# Altium schematic symbol library Semi-ATE.SchLib: 322 symbols (part 1 of 6) (continued)
## C+_1 (continued)
CAP TANT 10UF 10% 35V 2312; 04. Manufacturer: Vishay Sprague; 07. Manufacturer  Part Number: TR3C106K035C0450; ESR: 450 mOhm; Type: Tantalum; 03. Unit Price: 0.4; 13. Created Date/Name: AUG2018/Hören; Design: AWGDIG; 3D-Export: No; ComponentLink1Description: Info; ComponentLink1URL: https://www.digikey.de/product-detail/en/vishay-sprague/TR3C106K035C0450/718-1323-2-ND/1579612; Tolerance: ±10%; Voltage Rating: 35V; 02. Distributor Part Number: 718-1323-2-ND; 09. Operating Temperature: -55°C ~ 125°C; 11. RoHS: YES; 01. Distributor: DigiKey; ComponentLink2Description: DataSheet; ComponentLink2URL: http://www.vishay.com/docs/40080/tr3.pdf; Package: 2312
simulation model CAP (Capacitor)
signal-integrity model Cap
footprint SMD-CAP-ALU-A (Ø3.0mm x 5.4mm)
footprint SMD-CAP-ALU-B (Ø4.0mm x 5.4mm)
footprint SMD-CAP-ALU-C (Ø5.0mm x 5.4mm)
footprint SMD-CAP-ALU-D (Ø6.3mm x 5.4mm)
footprint SMD-CAP-ALU-D8 (Ø6.3mm x 7.7mm)
footprint SMD-CAP-ALU-E (Ø8.0mm x 6.2mm)
footprint SMD-CAP-ALU-F (Ø8.0mm x 10.2mm)
footprint SMD-CAP-ALU-G (Ø10.0mm x 10.2mm)
footprint SMD-CAP-ALU-G13 (Ø10.0mm x 13.5mm)
footprint SMD-CAP-ALU-G17 (Ø10.0mm x 16.5mm)
footprint SMD-CAP-ALU-H16 (Ø12.5mm x 16.5mm)
footprint SMD-CAP-ALU-K16 (Ø18mm x 16.5mm)
footprint C2312 (SMT 2312 Tantalum)
pins: 1, 2
text: +

## C+_2
designator C?, comment value 100uF  (hidden comment: C+)
CAP TANT 100UF 10% 6.3V 1411; 04. Manufacturer: AVX Corporation; 07. Manufacturer  Part Number: TPSB107K006R0250; ESR: 250mΩ; Type: Tantalum; 03. Unit Price: 0.58; 13. Created Date/Name: AUG2018/Hören; 3D-Export: No; ComponentLink1Description: Info; ComponentLink1URL: https://www.digikey.de/products/en?keywords=478-3080-1-ND; Tolerance: ±10%; Voltage Rating: 6.3V; 02. Distributor Part Number: 478-3080-1-ND; 09. Operating Temperature: -55°C ~ 125°C; 11. RoHS: YES; 01. Distributor: DigiKey; ComponentLink2Description: DataSheet; ComponentLink2URL: http://datasheets.avx.com/TPS.pdf; Package: 1210
simulation model CAP (Capacitor)
signal-integrity model Cap
footprint SMD-CAP-ALU-A (Ø3.0mm x 5.4mm)
footprint SMD-CAP-ALU-B (Ø4.0mm x 5.4mm)
footprint SMD-CAP-ALU-C (Ø5.0mm x 5.4mm)
footprint SMD-CAP-ALU-D (Ø6.3mm x 5.4mm)
footprint SMD-CAP-ALU-D8 (Ø6.3mm x 7.7mm)
footprint SMD-CAP-ALU-E (Ø8.0mm x 6.2mm)
footprint SMD-CAP-ALU-F (Ø8.0mm x 10.2mm)
footprint SMD-CAP-ALU-G (Ø10.0mm x 10.2mm)
footprint SMD-CAP-ALU-G13 (Ø10.0mm x 13.5mm)
footprint SMD-CAP-ALU-G17 (Ø10.0mm x 16.5mm)
footprint SMD-CAP-ALU-H16 (Ø12.5mm x 16.5mm)
footprint SMD-CAP-ALU-K16 (Ø18mm x 16.5mm)
footprint C0603+ Reflow (SMT Capacitor 0603 Polarized Reflow Soldering)
footprint C0603+ Wave (SMT Capacitor 0603 Polarized Wave Soldering)
footprint C1206+ Reflow (SMT Capacitor 1206 Polarized Reflow Soldering)
footprint C1206+ Wave (SMT Capacitor 1206 Polarized Wave Soldering)
footprint C1210+ Reflow (SMT Capacitor 1210 Polarized Reflow Soldering)
footprint C1210+ Wave (SMT Capacitor 1210 Polarized Wave Soldering)
footprint C2312+ Reflow (SMT Capacitor 2312 Polarized Reflow Soldering)
footprint C2312+ Wave (SMT Capacitor 2312 Polarized Wave Soldering)
footprint C0805+ Reflow (SMT Capacitor 0805 Polarized Reflow Soldering)
footprint C0805+ Wave (SMT Capacitor 0805 Polarized Wave Soldering)
pins: 1, 2
text: +

## C+_3
designator C?, comment value 10uF  Tolerance: ±20%  Type: Tantalum  Package: 0805  (hidden comment: C+)
CAP TANT 10UF 20% 10V 0805; 04. Manufacturer: AVX Corporation; 07. Manufacturer  Part Number: TPSP106M010R2000; ESR: 2Ohm; 03. Unit Price: 1.07; 13. Created Date/Name: AUG2018/Hören; 3D-Export: No; ComponentLink1Description: Info; ComponentLink1URL: https://www.digikey.de/products/en?keywords=478-9264-1-ND; Voltage Rating: 10V; 02. Distributor Part Number: 478-9264-1-ND; 09. Operating Temperature: -55°C ~ 125°C; 11. RoHS: YES; 01. Distributor: DigiKey; ComponentLink2Description: DataSheet; ComponentLink2URL: http://datasheets.avx.com/TPS.pdf
simulation model CAP (Capacitor)
signal-integrity model Cap
footprint SMD-CAP-ALU-A (Ø3.0mm x 5.4mm)
footprint SMD-CAP-ALU-B (Ø4.0mm x 5.4mm)
footprint SMD-CAP-ALU-C (Ø5.0mm x 5.4mm)
footprint SMD-CAP-ALU-D (Ø6.3mm x 5.4mm)
footprint SMD-CAP-ALU-D8 (Ø6.3mm x 7.7mm)
footprint SMD-CAP-ALU-E (Ø8.0mm x 6.2mm)
footprint SMD-CAP-ALU-F (Ø8.0mm x 10.2mm)
footprint SMD-CAP-ALU-G (Ø10.0mm x 10.2mm)
footprint SMD-CAP-ALU-G13 (Ø10.0mm x 13.5mm)
footprint SMD-CAP-ALU-G17 (Ø10.0mm x 16.5mm)
footprint SMD-CAP-ALU-H16 (Ø12.5mm x 16.5mm)
footprint SMD-CAP-ALU-K16 (Ø18mm x 16.5mm)
footprint C0603+ Reflow (SMT Capacitor 0603 Polarized Reflow Soldering)
footprint C0603+ Wave (SMT Capacitor 0603 Polarized Wave Soldering)
footprint C1206+ Reflow (SMT Capacitor 1206 Polarized Reflow Soldering)
footprint C1206+ Wave (SMT Capacitor 1206 Polarized Wave Soldering)
footprint C1210+ Reflow (SMT Capacitor 1210 Polarized Reflow Soldering)
footprint C1210+ Wave (SMT Capacitor 1210 Polarized Wave Soldering)
footprint C2312+ Reflow (SMT Capacitor 2312 Polarized Reflow Soldering)
footprint C2312+ Wave (SMT Capacitor 2312 Polarized Wave Soldering)
footprint C0805+ Reflow (SMT Capacitor 0805 Polarized Reflow Soldering)
footprint C0805+ Wave (SMT Capacitor 0805 Polarized Wave Soldering)
pins: 1, 2
text: +

## C+_4
designator C?, comment value 1uF  Type: Tantalum  Package: 0805  (hidden comment: C+)
CAP TANT 1UF 10% 25V 0805; 04. Manufacturer: AVX Corporation; 07. Manufacturer  Part Number: TPSR105K025R2500; ESR: 2.5Ohm; 03. Unit Price: 0.55; 13. Created Date/Name: AUG2018/Hören; 3D-Export: No; ComponentLink1Description: Info; ComponentLink1URL: https://www.digikey.de/products/en?keywords=478-11121-1-ND; Tolerance: ±10%; Voltage Rating: 25V; 02. Distributor Part Number: 478-11121-1-ND; 09. Operating Temperature: -55°C ~ 125°C; 11. RoHS: YES; 01. Distributor: DigiKey; ComponentLink2Description: DataSheet; ComponentLink2URL: http://datasheets.avx.com/TPS.pdf
simulation model CAP (Capacitor)
signal-integrity model Cap
footprint SMD-CAP-ALU-A (Ø3.0mm x 5.4mm)
footprint SMD-CAP-ALU-B (Ø4.0mm x 5.4mm)
footprint SMD-CAP-ALU-C (Ø5.0mm x 5.4mm)
footprint SMD-CAP-ALU-D (Ø6.3mm x 5.4mm)
footprint SMD-CAP-ALU-D8 (Ø6.3mm x 7.7mm)
footprint SMD-CAP-ALU-E (Ø8.0mm x 6.2mm)
footprint SMD-CAP-ALU-F (Ø8.0mm x 10.2mm)
footprint SMD-CAP-ALU-G (Ø10.0mm x 10.2mm)
footprint SMD-CAP-ALU-G13 (Ø10.0mm x 13.5mm)
footprint SMD-CAP-ALU-G17 (Ø10.0mm x 16.5mm)
footprint SMD-CAP-ALU-H16 (Ø12.5mm x 16.5mm)
footprint SMD-CAP-ALU-K16 (Ø18mm x 16.5mm)
footprint C0603+ Reflow (SMT Capacitor 0603 Polarized Reflow Soldering)
footprint C0603+ Wave (SMT Capacitor 0603 Polarized Wave Soldering)
footprint C1206+ Reflow (SMT Capacitor 1206 Polarized Reflow Soldering)
footprint C1206+ Wave (SMT Capacitor 1206 Polarized Wave Soldering)
footprint C1210+ Reflow (SMT Capacitor 1210 Polarized Reflow Soldering)
footprint C1210+ Wave (SMT Capacitor 1210 Polarized Wave Soldering)
footprint C2312+ Reflow (SMT Capacitor 2312 Polarized Reflow Soldering)
footprint C2312+ Wave (SMT Capacitor 2312 Polarized Wave Soldering)
footprint C0805+ Reflow (SMT Capacitor 0805 Polarized Reflow Soldering)
footprint C0805+ Wave (SMT Capacitor 0805 Polarized Wave Soldering)
pins: 1, 2
text: +

## C_1
designator C?, comment value 47uF  (hidden comment: C)
CAP CER 47UF 10V X5R 1206; MFR-PN: GRM32ER71A476KE15L; MFR: MURATA; MFR-TYPE: GRM series; 04. Manufacturer: Samsung Electro-Mechanics; 07. Manufacturer  Part Number: CL31A476MPHNNNE; POPULATED: yes; Parameters: X7R, 10V, 10%; 03. Unit Price: 0.64; Tolerance: ±20%; Type: X7R; 3D-Export: No; Temperature Range: -55°C ~ 85°C; 01. Distributor: DigiKey; 02. Distributor Part Number: 1276-3063-6-ND; 09. Operating Temperature: -55°C ~ 85°C; 11. RoHS: YES; Voltage Rating: 10V; ComponentLink4Description: Info; ComponentLink4URL: https://www.digikey.de/product-detail/en/samsung-electro-mechanics/CL31A476MPHNNNE/1276-3063-6-ND/3893578; ComponentLink5Description: DataSheet; ComponentLink5URL: https://media.digikey.com/pdf/Data%20Sheets/Samsung%20PDFs/CL_Series_MLCC_ds.pdf
footprint C1206 (Footprint not found)
signal-integrity model Cap
simulation model CAP
footprint C1210
footprint C1206 Reflow
pins: 1, 2
2 alternate drawings of the same symbol

## C_2
designator C?, comment value 1uF  (hidden comment: C)
CAP CER 1UF 10V X5R 0402; 04. Manufacturer: Samsung Electro-Mechanics; 07. Manufacturer  Part Number: CL05A105KP5NNNC; POPULATED: yes; Parameters: X7R, 10V, 10%; 03. Unit Price: 0.09; Tolerance: 10%; Type: X7R; 3D-Export: No; Temperature Range: -40°C/+85°C; 01. Distributor: DigiKey; 02. Distributor Part Number: 1276-1076-6-ND; 09. Operating Temperature: -55°C ~ 85°C; 11. RoHS: YES; Voltage Rating: 10V; ComponentLink4Description: Info; ComponentLink4URL: https://www.digikey.de/product-detail/en/samsung-electro-mechanics/CL05A105KP5NNNC/1276-1076-6-ND/3891590; ComponentLink5Description: DataSheet; ComponentLink5URL: https://media.digikey.com/pdf/Data%20Sheets/Samsung%20PDFs/CL_Series_MLCC_ds.pdf
footprint C0603 (Footprint not found)
footprint C0402 (Chip Capacitor; Body 1.0x0.5mm (LxW typ), IPC High Density)
signal-integrity model Cap
simulation model CAP
footprint C0402 RevOne
pins: 1, 2
2 alternate drawings of the same symbol

## C_3
designator C?, comment value 100nF  (hidden comment: C)
CAP CER 0.1UF 25V X7R 0402; 04. Manufacturer: Yageo; 07. Manufacturer  Part Number: CC0402KRX7R8BB104; POPULATED: yes; Parameters: X7R, 25V, 10%; 03. Unit Price: 0.09; Tolerance: 10%; 3D-Export: No; Temperature Range: -40°C/+85°C; 01. Distributor: DigiKey; 02. Distributor Part Number: 311-2077-6-ND; 09. Operating Temperature: -55°C ~ 125°C; 11. RoHS: YES; Type: X7R; Voltage Rating: 25V
footprint C0402 (Footprint not found)
signal-integrity model Cap
simulation model CAP
footprint C0402 RevOne
pins: 1, 2
2 alternate drawings of the same symbol

## C_4
designator C?, comment value 4u7F  (hidden comment: C)
CAP CER 4.7UF 6.3V X5R 0402; 04. Manufacturer: Samsung Electro-Mechanics; 07. Manufacturer  Part Number: CL05A475KQ5NRNC; POPULATED: yes; Parameters: X7R, 6V3, 10%; 03. Unit Price: 0.28; Tolerance: 10%; Type: X7R; Voltage Rating: 6V3; 3D-Export: No; Temperature Range: -40°C/+85°C; 01. Distributor: DigiKey; 02. Distributor Part Number: 1276-1481-6-ND; 09. Operating Temperature: -55°C ~ 85°C; 11. RoHS: YES; ComponentLink4Description: DataSheet; ComponentLink4URL: https://media.digikey.com/pdf/Data%20Sheets/Samsung%20PDFs/CL_Series_MLCC_ds.pdf; ComponentLink5Description: Info; ComponentLink5URL: https://www.digikey.de/product-detail/en/samsung-electro-mechanics/CL05A475KQ5NRNC/1276-1481-6-ND/3891995
footprint C0402 (Chip Capacitor; Body 1.0x0.5mm (LxW typ), IPC High Density)
signal-integrity model Cap
simulation model CAP
footprint C0805
footprint C0402 RevOne
pins: 1, 2
2 alternate drawings of the same symbol

## C_5
designator C?, comment value 470nF  (hidden comment: C)
CAP CER 0.47UF 10V X5R 0402; 04. Manufacturer: Samsung Electro-Mechanics; 07. Manufacturer  Part Number: CL05A474KP5NNNC; POPULATED: yes; Parameters: X5R, 10V, 10%; 03. Unit Price: 0.09; Tolerance: 10%; 3D-Export: No; Temperature Range: -55°C ~ 85°C; 01. Distributor: DigiKey; 02. Distributor Part Number: 1276-1173-6-ND; 09. Operating Temperature: -55°C ~ 85°C; 11. RoHS: YES; Type: X5R; Voltage Rating: 10V; ComponentLink4Description: Info; ComponentLink4URL: https://www.digikey.de/product-detail/en/samsung-electro-mechanics/CL05A474KP5NNNC/1276-1173-6-ND/3891687; ComponentLink5Description: DataSheet; ComponentLink5URL: https://media.digikey.com/pdf/Data%20Sheets/Samsung%20PDFs/CL_Series_MLCC_ds.pdf
footprint C0402 (Chip Capacitor; Body 1.0x0.5mm (LxW typ), IPC High Density)
signal-integrity model Cap
simulation model CAP
footprint C0402 RevOne
pins: 1, 2
2 alternate drawings of the same symbol

## C_6
designator C?, comment value 10µF  Package: 0603  (hidden comment: C)
CAP CER 10UF 16V X5R 0603; 04. Manufacturer: Murata Electronics North America; 07. Manufacturer  Part Number: GRM188R61C106KAALD; Tolerance: ±10%; 03. Unit Price: 0.43; 08. Inhouse Stock: -40°C/+85°C; 13. Created Date/Name: AUG2018/Hören; Design: AWGDIG; 3D-Export: No; Voltage Rating: 16V; Type: X5R; ComponentLink1Description: Info; ComponentLink1URL: https://www.digikey.de/products/en?keywords=490-10728-6-ND; 02. Distributor Part Number: 490-10728-6-ND; 09. Operating Temperature: -55°C ~ 85°C; 11. RoHS: YES; 01. Distributor: DigiKey; ComponentLink2Description: DataSheet; ComponentLink2URL: https://search.murata.co.jp/Ceramy/image/img/A01X/G101/ENG/GRM188R61C106KAAL-01.pdf
simulation model CAP (Capacitor)
signal-integrity model Cap
footprint C0201
footprint C0402 (SMT Capacitor 0402)
footprint C0603 (SMT Capacitor 0603)
footprint C0603 (SMT Capacitor 0603)
footprint C0805 (SMT Capacitor 0805)
footprint C1206 (SMT Capacitor 1206)
footprint C1210 (SMT Capacitor 1210)
footprint C1632
footprint C1825
footprint C2225
footprint C0603 Reflow
pins: 1, 2
text: .

## C_7
designator C?, comment value 10nF  (hidden comment: C)
CAP CER 10000PF 10V X7R 0402; 04. Manufacturer: KEMET; 07. Manufacturer  Part Number: C0402C103K8RACTU; Tolerance: ±10%; Voltage Rating: 16V; 03. Unit Price: 0.09; 13. Created Date/Name: AUG2018/Hören; Design: AWGDIG; 3D-Export: No; Type: X7R; ComponentLink1Description: Info; ComponentLink1URL: https://www.digikey.de/product-detail/en/kemet/C0402C103K8RACTU/399-7759-6-ND/3472290; 02. Distributor Part Number: 399-7759-6-ND; 09. Operating Temperature: -55°C ~ 125°C; 11. RoHS: YES; 01. Distributor: DigiKey; ComponentLink2Description: DataSheet; ComponentLink2URL: https://api.kemet.com/component-edge/download/datasheet/C0402C103K8RACTU.pdf; Package: 0402
simulation model CAP (Capacitor)
signal-integrity model Cap
footprint C0201
footprint C0402 (SMT Capacitor 0402)
footprint C0603 (SMT Capacitor 0603)
footprint C0603 (SMT Capacitor 0603)
footprint C0805 (SMT Capacitor 0805)
footprint C1206 (SMT Capacitor 1206)
footprint C1210 (SMT Capacitor 1210)
footprint C1632
footprint C1825
footprint C2225
footprint C0402 RevOne
pins: 1, 2
text: .

## C_8
designator C?, comment value 1nF  (hidden comment: C)
CAP CER 1000PF 25V X7R 0402; 04. Manufacturer: Yageo; 07. Manufacturer  Part Number: CC0402KRX7R8BB102; Tolerance: ±10%; 03. Unit Price: 0.09; 13. Created Date/Name: AUG2018/Hören; Design: AWGDIG; 3D-Export: No; Voltage Rating: 25V; Type: X7R; ComponentLink1Description: Info; ComponentLink1URL: https://www.digikey.de/product-detail/en/yageo/CC0402KRX7R8BB102/311-1712-6-ND/5196110; 02. Distributor Part Number: 311-1712-6-ND; 09. Operating Temperature: -55°C ~ 125°C; 11. RoHS: YES; 01. Distributor: DigiKey; ComponentLink2Description: DataSheet; ComponentLink2URL: http://www.yageo.com/documents/recent/UPY-GPHC_X7R_6.3V-to-50V_18.pdf; Package: 0402
simulation model CAP (Capacitor)
signal-integrity model Cap
footprint C0201
footprint C0402 (SMT Capacitor 0402)
footprint C0603 (SMT Capacitor 0603)
footprint C0603 (SMT Capacitor 0603)
footprint C0805 (SMT Capacitor 0805)
footprint C1206 (SMT Capacitor 1206)
footprint C1210 (SMT Capacitor 1210)
footprint C1632
footprint C1825
footprint C2225
footprint C0402 Reflow
pins: 1, 2
text: .

## C_9
designator C?, comment value 100nF  (hidden comment: C)
CAP CER 0.1UF 16V X7R 0402; 04. Manufacturer: Samsung Electro-Mechanics; 07. Manufacturer  Part Number: CL05B104KO5NNNC; Tolerance: ±10%; 03. Unit Price: 0.09; 13. Created Date/Name: AUG2018/Hören; Design: AWGDIG; 3D-Export: No; Voltage Rating: 16V; Type: X7R; ComponentLink1Description: Info; ComponentLink1URL: https://www.digikey.de/product-detail/en/samsung-electro-mechanics/CL05B104KO5NNNC/1276-1001-6-ND/3891515; 02. Distributor Part Number: 1276-1001-6-ND; 09. Operating Temperature: -55°C ~ 125°C; 11. RoHS: YES; 01. Distributor: DigiKey; ComponentLink2Description: DataSheet; ComponentLink2URL: http://www.samsungsem.com/kr/support/product-search/mlcc/__icsFiles/afieldfile/2018/07/18/CL05B104KO5NNNC.pdf; Package: 0402.
simulation model CAP (Capacitor)
signal-integrity model Cap
footprint C0201
footprint C0402 (SMT Capacitor 0402)
footprint C0603 (SMT Capacitor 0603)
footprint C0603 (SMT Capacitor 0603)
footprint C0805 (SMT Capacitor 0805)
footprint C1206 (SMT Capacitor 1206)
footprint C1210 (SMT Capacitor 1210)
footprint C1632
footprint C1825
footprint C2225
footprint C0402 Reflow
pins: 1, 2
text: .

## C_10
designator C?, comment value 10µF  Package: 0603  (hidden comment: C)
CAP CER 10UF 16V X5R 0603; 04. Manufacturer: Murata Electronics North America; 07. Manufacturer  Part Number: GRM188R61C106KAALD; Tolerance: ±10%; 03. Unit Price: 0.43; 13. Created Date/Name: AUG2018/Hören; Design: AWGDIG; 3D-Export: No; Voltage Rating: 16V; Type: X5R; ComponentLink1Description: Info; ComponentLink1URL: https://www.digikey.de/products/en?keywords=490-10728-6-ND; 02. Distributor Part Number: 490-10728-6-ND; 09. Operating Temperature: -55°C ~ 85°C; 11. RoHS: YES; 01. Distributor: DigiKey; ComponentLink2Description: DataSheet; ComponentLink2URL: https://search.murata.co.jp/Ceramy/image/img/A01X/G101/ENG/GRM188R61C106KAAL-01.pdf
simulation model CAP (Capacitor)
signal-integrity model Cap
footprint C0201
footprint C0402 (SMT Capacitor 0402)
footprint C0603 (SMT Capacitor 0603)
footprint C0603 (SMT Capacitor 0603)
footprint C0805 (SMT Capacitor 0805)
footprint C1206 (SMT Capacitor 1206)
footprint C1210 (SMT Capacitor 1210)
footprint C1632
footprint C1825
footprint C2225
footprint C0603 Reflow
pins: 1, 2
text: .

## C_11
designator C?, comment value 820pF  Tolerance: ±5%  (hidden comment: C)
CAP CER 820PF 50V X7R 0402; 04. Manufacturer: AVX Corporation; 07. Manufacturer  Part Number: 04025C821JAT2A; 03. Unit Price: 0.34; 13. Created Date/Name: AUG2018/Hören; Design: AWGDIG; 3D-Export: No; Voltage Rating: 50V; Type: X7R; ComponentLink1Description: Info; ComponentLink1URL: https://www.digikey.de/product-detail/en/avx-corporation/04025C821JAT2A/478-10130-6-ND/6796643; 02. Distributor Part Number: 478-10130-6-ND; 09. Operating Temperature: -55°C ~ 125°C; 11. RoHS: YES; 01. Distributor: DigiKey; ComponentLink2Description: DataSheet; ComponentLink2URL: http://datasheets.avx.com/X7RDielectric.pdf; Package: 0402
simulation model CAP (Capacitor)
signal-integrity model Cap
footprint C0201
footprint C0402 (SMT Capacitor 0402)
footprint C0603 (SMT Capacitor 0603)
footprint C0603 (SMT Capacitor 0603)
footprint C0805 (SMT Capacitor 0805)
footprint C1206 (SMT Capacitor 1206)
footprint C1210 (SMT Capacitor 1210)
footprint C1632
footprint C1825
footprint C2225
footprint C0402 Reflow
pins: 1, 2
text: .

## C_12
designator C?, comment value 68nF  Tolerance: ±5%  (hidden comment: C)
CAP CER SMD 0402 .068UF 5% X7R; 04. Manufacturer: KEMET; 07. Manufacturer  Part Number: C0402C683J4RAC7867; Voltage Rating: 16V; 03. Unit Price: 0.5; 13. Created Date/Name: AUG2018/Hören; Design: AWGDIG; 3D-Export: No; Type: X7R; ComponentLink1Description: Info; ComponentLink1URL: https://www.digikey.de/products/en/capacitors/ceramic-capacitors/60?k=&pkeyword=&sv=0&pv3=2&sf=0&FV=1c00f3%2C400004%2C1f140000%2Cmu0.068%C2%B5F%7C2049%2Cffe0003c%2C440005&quantity=&ColumnSort=0&page=1&pageSize=25; 02. Distributor Part Number: 399-17560-6-ND; 09. Operating Temperature: -55°C ~ 125°C; 11. RoHS: YES; 01. Distributor: DigiKey; ComponentLink2Description: DataSheet; ComponentLink2URL: https://content.kemet.com/datasheets/KEM_C1002_X7R_SMD.pdf; Package: 0402
simulation model CAP (Capacitor)
signal-integrity model Cap
footprint C0201
footprint C0402 (SMT Capacitor 0402)
footprint C0603 (SMT Capacitor 0603)
footprint C0603 (SMT Capacitor 0603)
footprint C0805 (SMT Capacitor 0805)
footprint C1206 (SMT Capacitor 1206)
footprint C1210 (SMT Capacitor 1210)
footprint C1632
footprint C1825
footprint C2225
footprint C0402 Reflow
pins: 1, 2
text: .

## C_13
designator C?, comment value 8pF  Tolerance: ±0.1pF  Package: 0603  (hidden comment: C)
CAP CER 8PF 250V C0G/NP0 0603; 04. Manufacturer: KEMET; 07. Manufacturer  Part Number: CBR06C809BAGAC; 03. Unit Price: 0.68; 13. Created Date/Name: AUG2018/Hören; Design: AWGDIG; 3D-Export: No; Voltage Rating: 250V; ComponentLink1Description: Info; ComponentLink1URL: https://www.digikey.de/products/en/capacitors/ceramic-capacitors/60?k=capacitor&k=&pkeyword=capacitor&sv=0&pv7=243&sf=1&FV=400005%2C1f140000%2Cmu8pF%7C2049%2Cffe0003c%2Cc004d&quantity=&ColumnSort=0&page=1&pageSize=25; 02. Distributor Part Number: 399-8740-6-ND; 09. Operating Temperature: -55°C ~ 125°C; 11. RoHS: YES; 01. Distributor: DigiKey; ComponentLink2Description: DataSheet; ComponentLink2URL: https://content.kemet.com/datasheets/KEM_C1030_CBR_SMD.pdf
simulation model CAP (Capacitor)
signal-integrity model Cap
footprint C0201
footprint C0402 (SMT Capacitor 0402)
footprint C0603 (SMT Capacitor 0603)
footprint C0603 (SMT Capacitor 0603)
footprint C0805 (SMT Capacitor 0805)
footprint C1206 (SMT Capacitor 1206)
footprint C1210 (SMT Capacitor 1210)
footprint C1632
footprint C1825
footprint C2225
footprint C0603 Reflow
pins: 1, 2
text: .

## C_14
designator C?, comment value 2.2nF  (hidden comment: C)
CAP CER 2200PF 50V X7R 0402; 04. Manufacturer: Murata Electronics North America; 07. Manufacturer  Part Number: GCM155R71H222KA37D; Tolerance: ±10%; Voltage Rating: >6.3V; 03. Unit Price: 0.09; 13. Created Date/Name: AUG2018/Hören; Design: AWGDIG; 3D-Export: No; Type: X7R; ComponentLink1Description: Info; ComponentLink1URL: https://www.digikey.de/product-detail/en/murata-electronics-north-america/GCM155R71H222KA37D/490-4914-1-ND/1765233; 02. Distributor Part Number: 490-4914-1-ND; 09. Operating Temperature: -55°C ~ 125°C; 11. RoHS: YES; 01. Distributor: DigiKey; ComponentLink2Description: DataSheet; ComponentLink2URL: http://psearch.en.murata.com/capacitor/product/GCM155R71H222KA37%23.pdf; Package: 0402
simulation model CAP (Capacitor)
signal-integrity model Cap
footprint C0201
footprint C0402 (SMT Capacitor 0402)
footprint C0603 (SMT Capacitor 0603)
footprint C0603 (SMT Capacitor 0603)
footprint C0805 (SMT Capacitor 0805)
footprint C1206 (SMT Capacitor 1206)
footprint C1210 (SMT Capacitor 1210)
footprint C1632
footprint C1825
footprint C2225
footprint C0402 Reflow
pins: 1, 2
text: .

## C_15
designator C?, comment value 47µF  Type: Tant  Package: 0603  (hidden comment: C)
CAP TANT 47UF 20% 6.3V 0603; 04. Manufacturer: AVX Corporation; 07. Manufacturer  Part Number: F980J476MMA; ESR: 10; 03. Unit Price: 0.62; 13. Created Date/Name: AUG2018/Hören; Design: AWGDIG; 3D-Export: No; Tolerance: ±20%; Voltage Rating: 6.3V; ComponentLink1Description: Info; ComponentLink1URL: *; 02. Distributor Part Number: 478-8644-6-ND; 09. Operating Temperature: -55°C ~ 125°C; 11. RoHS: YES; 01. Distributor: DigiKey; ComponentLink2Description: DataSheet
simulation model CAP (Capacitor)
signal-integrity model Cap
footprint C0201
footprint C0402 (SMT Capacitor 0402)
footprint C0603 (SMT Capacitor 0603)
footprint C0603 (SMT Capacitor 0603)
footprint C0805 (SMT Capacitor 0805)
footprint C1206 (SMT Capacitor 1206)
footprint C1210 (SMT Capacitor 1210)
footprint C1632
footprint C1825
footprint C2225
footprint C0603 Reflow
pins: 1, 2
text: .

## C_16
designator C?, comment value 10nF  (hidden comment: C)
CAP CER 10000PF 16V X7R 0402; 04. Manufacturer: Samsung Electro-Mechanics; 07. Manufacturer  Part Number: CL05B103KO5NNWC; Tolerance: ±10%; 03. Unit Price: 0.09; 13. Created Date/Name: AUG2018/Hören; Design: AWGDIG; 3D-Export: No; Voltage Rating: 16V; Type: X7R; ComponentLink1Description: Info; ComponentLink1URL: *; 02. Distributor Part Number: 1276-1501-1-ND; 09. Operating Temperature: -55°C ~ 125°C; 11. RoHS: YES; 01. Distributor: DigiKey; ComponentLink2Description: DataSheet; Package: 0402
simulation model CAP (Capacitor)
signal-integrity model Cap
footprint C0201
footprint C0402 (SMT Capacitor 0402)
footprint C0603 (SMT Capacitor 0603)
footprint C0603 (SMT Capacitor 0603)
footprint C0805 (SMT Capacitor 0805)
footprint C1206 (SMT Capacitor 1206)
footprint C1210 (SMT Capacitor 1210)
footprint C1632
footprint C1825
footprint C2225
footprint C0402 Reflow
pins: 1, 2
text: .

## C_17
designator C?, comment value 4.7µF  (hidden comment: C)
CAP CER 4.7UF 10V X5R 0402; 04. Manufacturer: Samsung Electro-Mechanics; 07. Manufacturer  Part Number: CL05A475KP5NRNC; Tolerance: ±10%; 03. Unit Price: 0.47; 13. Created Date/Name: AUG2018/Hören; Design: AWGDIG; 3D-Export: No; Voltage Rating: 10V; Type: X5R; ComponentLink1Description: Info; ComponentLink1URL: https://www.digikey.de/product-detail/en/samsung-electro-mechanics/CL05A475KP5NRNC/1276-1480-6-ND/3891994; 02. Distributor Part Number: 1276-1480-6-ND; 09. Operating Temperature: -55°C ~ 85°C; 11. RoHS: YES; 01. Distributor: DigiKey; ComponentLink2Description: DataSheet; ComponentLink2URL: http://www.samsungsem.com/kr/support/product-search/mlcc/__icsFiles/afieldfile/2018/06/21/CL05A475KP5NRNC.pdf; Package: 0402
simulation model CAP (Capacitor)
signal-integrity model Cap
footprint C0201
footprint C0402 (SMT Capacitor 0402)
footprint C0603 (SMT Capacitor 0603)
footprint C0603 (SMT Capacitor 0603)
footprint C0805 (SMT Capacitor 0805)
footprint C1206 (SMT Capacitor 1206)
footprint C1210 (SMT Capacitor 1210)
footprint C1632
footprint C1825
footprint C2225
footprint C0402 Reflow
pins: 1, 2
text: .

## C_18
designator C?, comment value 100nF  (hidden comment: C)
CAP CER 0.1UF 50V X7R 0402; 04. Manufacturer: TDK Corporation; 07. Manufacturer  Part Number: CGA2B3X7R1H104K050BB; Tolerance: ±10%; 03. Unit Price: 0.15; 13. Created Date/Name: AUG2018/Hören; 3D-Export: No; Voltage Rating: 50V; Type: X7R; ComponentLink1Description: Info; ComponentLink1URL: https://www.digikey.de/products/en/capacitors/ceramic-capacitors/60?k=CGA2B3X7R1H104K050BB&k=&pkeyword=CGA2B3X7R1H104K050BB&sv=0&pv7=243&sf=0&quantity=&ColumnSort=0&page=1&pageSize=25; 02. Distributor Part Number: 445-6899-6-ND; 09. Operating Temperature: -55°C ~ 125°C; 11. RoHS: YES; 01. Distributor: DigiKey; ComponentLink2Description: DataSheet; Package: 0402
simulation model CAP (Capacitor)
signal-integrity model Cap
footprint C0201 Reflow (SMT Capacitor 0201 Reflow Soldering)
footprint C0402 Reflow (SMT CAP 0402 Reflow Soldering)
footprint C0603 Reflow (SMT Capacitor 0603 Reflow Soldering)
footprint C0603 Wave (SMT Capacitor 0603 Wave Soldering)
footprint C0805 Reflow (SMT Capacitor 0805 Reflow Soldering)
footprint C0805 Wave (SMT Capacitor 0805 Wave Soldering)
footprint Model Name (Footprint not found)
footprint Model Name (Footprint not found)
footprint C1206 Reflow (SMT Capacitor 1206 Reflow Soldering)
footprint C1206 Wave (SMT Capacitor 1206 Wave Soldering)
footprint C1210 Reflow (SMT Capacitor 1210 Reflow Soldering)
footprint C1210 Wave (SMT Capacitor 1210 Wave Soldering)
footprint C1632 Reflow (SMT Capacitor 1632 Reflow Soldering)
footprint C1632 Wave (SMT Capacitor 1632 Wave Soldering)
footprint C1808 Reflow (SMT Capacitor 1808 Reflow Soldering)
footprint C1808 Wave (SMT Capacitor 1808 Wave Soldering)
footprint C1825 Reflow (SMT Capacitor 1825 Reflow Soldering)
footprint C1825 Wave (SMT Capacitor 1825 Wave Soldering)
footprint C2220 Reflow (SMT Capacitor 2220 Reflow Soldering)
footprint C2220 Wave (SMT Capacitor 2220 Wave Soldering)
footprint C2225 Reflow (SMT Capacitor 2225 Reflow Soldering)
footprint C2225 Wave (SMT Capacitor 2225 Wave Soldering)
pins: 1, 2
text: .

## C_19
designator C?, comment value 1uF  (hidden comment: C)
CAP CER 1UF 10V X7R 0603; 04. Manufacturer: Samsung Electro-Mechanics; 07. Manufacturer  Part Number: CL10B105KP8NNNC; Tolerance: ±10%; 03. Unit Price: 0.09; 13. Created Date/Name: AUG2018/Hören; 3D-Export: No; Voltage Rating: 10V; Type: X7R; ComponentLink1Description: Info; ComponentLink1URL: https://www.digikey.de/products/en?keywords=1276-1946-6-ND; 02. Distributor Part Number: 1276-1946-6-ND; 09. Operating Temperature: -55°C ~ 125°C; 11. RoHS: YES; 01. Distributor: DigiKey; ComponentLink2Description: DataSheet; ComponentLink2URL: https://media.digikey.com/pdf/Data%20Sheets/Samsung%20PDFs/CL_Series_MLCC_ds.pdf; Package: 0603
simulation model CAP (Capacitor)
signal-integrity model Cap
footprint C0201 Reflow (SMT Capacitor 0201 Reflow Soldering)
footprint C0402 Reflow (SMT CAP 0402 Reflow Soldering)
footprint C0603 Reflow (SMT Capacitor 0603 Reflow Soldering)
footprint C0603 Wave (SMT Capacitor 0603 Wave Soldering)
footprint C0805 Reflow (SMT Capacitor 0805 Reflow Soldering)
footprint C0805 Wave (SMT Capacitor 0805 Wave Soldering)
footprint Model Name (Footprint not found)
footprint Model Name (Footprint not found)
footprint C1206 Reflow (SMT Capacitor 1206 Reflow Soldering)
footprint C1206 Wave (SMT Capacitor 1206 Wave Soldering)
footprint C1210 Reflow (SMT Capacitor 1210 Reflow Soldering)
footprint C1210 Wave (SMT Capacitor 1210 Wave Soldering)
footprint C1632 Reflow (SMT Capacitor 1632 Reflow Soldering)
footprint C1632 Wave (SMT Capacitor 1632 Wave Soldering)
footprint C1808 Reflow (SMT Capacitor 1808 Reflow Soldering)
footprint C1808 Wave (SMT Capacitor 1808 Wave Soldering)
footprint C1825 Reflow (SMT Capacitor 1825 Reflow Soldering)
footprint C1825 Wave (SMT Capacitor 1825 Wave Soldering)
footprint C2220 Reflow (SMT Capacitor 2220 Reflow Soldering)
footprint C2220 Wave (SMT Capacitor 2220 Wave Soldering)
footprint C2225 Reflow (SMT Capacitor 2225 Reflow Soldering)
footprint C2225 Wave (SMT Capacitor 2225 Wave Soldering)
pins: 1, 2
text: .